# Altium schematic symbol library jlcpcb_2025_04_ferrites_extended_0603.schlib: 833 symbols (part 4 of 4) (continued)
## UPZ1608G600-1R2TF
designator FB?  Impedance @ Frequency: 60Ω@100MHz
Ferrite, 60Ω@100MHz, ±25%, 100mΩ, 1.2A, SMD 0603; Manufacturer: Sunlord; Manufacturer Part Number: UPZ1608G600-1R2TF; Package Size: 0603; JLCPCB Basic Part: No; JLCPCB Part Number: C305248; Supplier 1: LCSC; Category: Ferrite Beads; Supplier Part Number 1: C305248; Tolerance: ±25%; Rated Current: 1.2A; DC Resistance: 100mΩ; RoHS: Yes; ComponentLink1Description: Datasheet; ComponentLink1URL: https://wmsc.lcsc.com/wmsc/upload/file/pdf/v2/lcsc/2310301641_Sunlord-UPZ1608G600-1R2TF_C305248.pdf; ComponentLink2Description: JLCPCB Part URL; ComponentLink2URL: https://jlcpcb.com/partdetail/C305248; ComponentLink3Description: LCSC Part URL; ComponentLink3URL: https://lcsc.com/product-detail/Ferrite-Beads_Sunlord-Sunlord-UPZ1608G600-1R2TF_C305248.html
footprint FB-0603 (0603 (1608M) Ferrite)
pins: 1, 2

## UPZ1608U121-3R0TF
designator FB?  Impedance @ Frequency: 120Ω@100MHz
Ferrite, 120Ω@100MHz, ±25%, 3A, SMD 0603; Manufacturer: Sunlord; Manufacturer Part Number: UPZ1608U121-3R0TF; Package Size: 0603; JLCPCB Basic Part: No; JLCPCB Part Number: C370571; Supplier 1: LCSC; Category: Ferrite Beads; Supplier Part Number 1: C370571; Tolerance: ±25%; Rated Current: 3A; RoHS: Yes; ComponentLink1Description: Datasheet; ComponentLink1URL: https://wmsc.lcsc.com/wmsc/upload/file/pdf/v2/lcsc/2310301641_Sunlord-UPZ1608U121-3R0TF_C370571.pdf; ComponentLink2Description: JLCPCB Part URL; ComponentLink2URL: https://jlcpcb.com/partdetail/C370571; ComponentLink3Description: LCSC Part URL; ComponentLink3URL: https://lcsc.com/product-detail/Ferrite-Beads_Sunlord-Sunlord-UPZ1608U121-3R0TF_C370571.html
pins: 1, 2

## UPZ1608U220-6R0TF
designator FB?  Impedance @ Frequency: 22Ω@100MHz
Ferrite, 22Ω@100MHz, ±25%, 10mΩ, 6A, SMD 0603; Manufacturer: Sunlord; Manufacturer Part Number: UPZ1608U220-6R0TF; Package Size: 0603; JLCPCB Basic Part: No; JLCPCB Part Number: C98301; Supplier 1: LCSC; Category: Ferrite Beads; Supplier Part Number 1: C98301; Tolerance: ±25%; Rated Current: 6A; DC Resistance: 10mΩ; RoHS: Yes; ComponentLink1Description: Datasheet; ComponentLink1URL: https://wmsc.lcsc.com/wmsc/upload/file/pdf/v2/lcsc/2310301641_Sunlord-UPZ1608U220-6R0TF_C98301.pdf; ComponentLink2Description: JLCPCB Part URL; ComponentLink2URL: https://jlcpcb.com/partdetail/C98301; ComponentLink3Description: LCSC Part URL; ComponentLink3URL: https://lcsc.com/product-detail/Ferrite-Beads_Sunlord-Sunlord-UPZ1608U220-6R0TF_C98301.html
footprint FB-0603 (0603 (1608M) Ferrite)
pins: 1, 2

## UPZ1608U221-2R2TF
designator FB?  Impedance @ Frequency: 220Ω@100MHz
Ferrite, 220Ω@100MHz, ±25%, 50mΩ, 2.2A, SMD 0603; Manufacturer: Sunlord; Manufacturer Part Number: UPZ1608U221-2R2TF; Package Size: 0603; JLCPCB Basic Part: No; JLCPCB Part Number: C279745; Supplier 1: LCSC; Category: Ferrite Beads; Supplier Part Number 1: C279745; Tolerance: ±25%; Rated Current: 2.2A; DC Resistance: 50mΩ; RoHS: Yes; ComponentLink1Description: Datasheet; ComponentLink1URL: https://wmsc.lcsc.com/wmsc/upload/file/pdf/v2/lcsc/2310301641_Sunlord-UPZ1608U221-2R2TF_C279745.pdf; ComponentLink2Description: JLCPCB Part URL; ComponentLink2URL: https://jlcpcb.com/partdetail/C279745; ComponentLink3Description: LCSC Part URL; ComponentLink3URL: https://lcsc.com/product-detail/Ferrite-Beads_Sunlord-Sunlord-UPZ1608U221-2R2TF_C279745.html
footprint FB-0603 (0603 (1608M) Ferrite)
pins: 1, 2

## UPZ1608U280-6R0TF
designator FB?  Impedance @ Frequency: 28Ω@100MHz
Ferrite, 28Ω@100MHz, ±25%, 10mΩ, 6A, SMD 0603; Manufacturer: Sunlord; Manufacturer Part Number: UPZ1608U280-6R0TF; Package Size: 0603; JLCPCB Basic Part: No; JLCPCB Part Number: C98302; Supplier 1: LCSC; Category: Ferrite Beads; Supplier Part Number 1: C98302; Tolerance: ±25%; Rated Current: 6A; DC Resistance: 10mΩ; RoHS: Yes; ComponentLink1Description: Datasheet; ComponentLink1URL: https://wmsc.lcsc.com/wmsc/upload/file/pdf/v2/lcsc/2310301641_Sunlord-UPZ1608U280-6R0TF_C98302.pdf; ComponentLink2Description: JLCPCB Part URL; ComponentLink2URL: https://jlcpcb.com/partdetail/C98302; ComponentLink3Description: LCSC Part URL; ComponentLink3URL: https://lcsc.com/product-detail/Ferrite-Beads_Sunlord-Sunlord-UPZ1608U280-6R0TF_C98302.html
footprint FB-0603 (0603 (1608M) Ferrite)
pins: 1, 2

## UPZ1608U301-1R5TF
designator FB?  Impedance @ Frequency: 300Ω@100MHz
Ferrite, 300Ω@100MHz, ±25%, 1.5A, SMD 0603; Manufacturer: Sunlord; Manufacturer Part Number: UPZ1608U301-1R5TF; Package Size: 0603; JLCPCB Basic Part: No; JLCPCB Part Number: C370572; Supplier 1: LCSC; Category: Ferrite Beads; Supplier Part Number 1: C370572; Tolerance: ±25%; Rated Current: 1.5A; RoHS: Yes; ComponentLink1Description: Datasheet; ComponentLink1URL: https://wmsc.lcsc.com/wmsc/upload/file/pdf/v2/lcsc/2310301641_Sunlord-UPZ1608U301-1R5TF_C370572.pdf; ComponentLink2Description: JLCPCB Part URL; ComponentLink2URL: https://jlcpcb.com/partdetail/C370572; ComponentLink3Description: LCSC Part URL; ComponentLink3URL: https://lcsc.com/product-detail/Ferrite-Beads_Sunlord-Sunlord-UPZ1608U301-1R5TF_C370572.html
pins: 1, 2

## UPZ1608U331-1R5TF
designator FB?  Impedance @ Frequency: 330Ω@100MHz
Ferrite, 330Ω@100MHz, ±25%, 70mΩ, 1.5A, SMD 0603; Manufacturer: Sunlord; Manufacturer Part Number: UPZ1608U331-1R5TF; Package Size: 0603; JLCPCB Basic Part: No; JLCPCB Part Number: C96999; Supplier 1: LCSC; Category: Ferrite Beads; Supplier Part Number 1: C96999; Tolerance: ±25%; Rated Current: 1.5A; DC Resistance: 70mΩ; RoHS: Yes; ComponentLink1Description: Datasheet; ComponentLink1URL: https://wmsc.lcsc.com/wmsc/upload/file/pdf/v2/lcsc/2310301641_Sunlord-UPZ1608U331-1R5TF_C96999.pdf; ComponentLink2Description: JLCPCB Part URL; ComponentLink2URL: https://jlcpcb.com/partdetail/C96999; ComponentLink3Description: LCSC Part URL; ComponentLink3URL: https://lcsc.com/product-detail/Ferrite-Beads_Sunlord-Sunlord-UPZ1608U331-1R5TF_C96999.html
footprint FB-0603 (0603 (1608M) Ferrite)
pins: 1, 2

## UPZ1608U331-1R7TF
designator FB?  Impedance @ Frequency: 330Ω@100MHz
Ferrite, 330Ω@100MHz, ±25%, 1.7A, SMD 0603; Manufacturer: Sunlord; Manufacturer Part Number: UPZ1608U331-1R7TF; Package Size: 0603; JLCPCB Basic Part: No; JLCPCB Part Number: C370573; Supplier 1: LCSC; Category: Ferrite Beads; Supplier Part Number 1: C370573; Tolerance: ±25%; Rated Current: 1.7A; RoHS: Yes; ComponentLink1Description: Datasheet; ComponentLink1URL: https://wmsc.lcsc.com/wmsc/upload/file/pdf/v2/lcsc/2310301641_Sunlord-UPZ1608U331-1R7TF_C370573.pdf; ComponentLink2Description: JLCPCB Part URL; ComponentLink2URL: https://jlcpcb.com/partdetail/C370573; ComponentLink3Description: LCSC Part URL; ComponentLink3URL: https://lcsc.com/product-detail/Ferrite-Beads_Sunlord-Sunlord-UPZ1608U331-1R7TF_C370573.html
pins: 1, 2

## UPZ1608U471-1R5TF
designator FB?  Impedance @ Frequency: 470Ω@100MHz
Ferrite, 470Ω@100MHz, ±25%, 120mΩ, 1.5A, SMD 0603; Manufacturer: Sunlord; Manufacturer Part Number: UPZ1608U471-1R5TF; Package Size: 0603; JLCPCB Basic Part: No; JLCPCB Part Number: C74335; Supplier 1: LCSC; Category: Ferrite Beads; Supplier Part Number 1: C74335; Tolerance: ±25%; Rated Current: 1.5A; DC Resistance: 120mΩ; RoHS: Yes; ComponentLink1Description: Datasheet; ComponentLink1URL: https://wmsc.lcsc.com/wmsc/upload/file/pdf/v2/lcsc/2310301641_Sunlord-UPZ1608U471-1R5TF_C74335.pdf; ComponentLink2Description: JLCPCB Part URL; ComponentLink2URL: https://jlcpcb.com/partdetail/C74335; ComponentLink3Description: LCSC Part URL; ComponentLink3URL: https://lcsc.com/product-detail/Ferrite-Beads_Sunlord-Sunlord-UPZ1608U471-1R5TF_C74335.html
footprint FB-0603 (0603 (1608M) Ferrite)
pins: 1, 2

## UPZ1608U601-1R3TF
designator FB?  Impedance @ Frequency: 600Ω@100MHz
Ferrite, 600Ω@100MHz, ±25%, 150mΩ, 1.3A, SMD 0603; Manufacturer: Sunlord; Manufacturer Part Number: UPZ1608U601-1R3TF; Package Size: 0603; JLCPCB Basic Part: No; JLCPCB Part Number: C97000; Supplier 1: LCSC; Category: Ferrite Beads; Supplier Part Number 1: C97000; Tolerance: ±25%; Rated Current: 1.3A; DC Resistance: 150mΩ; RoHS: Yes; ComponentLink1Description: Datasheet; ComponentLink1URL: https://wmsc.lcsc.com/wmsc/upload/file/pdf/v2/lcsc/2310301642_Sunlord-UPZ1608U601-1R3TF_C97000.pdf; ComponentLink2Description: JLCPCB Part URL; ComponentLink2URL: https://jlcpcb.com/partdetail/C97000; ComponentLink3Description: LCSC Part URL; ComponentLink3URL: https://lcsc.com/product-detail/Ferrite-Beads_Sunlord-Sunlord-UPZ1608U601-1R3TF_C97000.html
footprint FB-0603 (0603 (1608M) Ferrite)
pins: 1, 2

## UPZ1608U700-4R0TF
designator FB?  Impedance @ Frequency: 70Ω@100MHz
Ferrite, 70Ω@100MHz, ±25%, 20mΩ, 4A, SMD 0603; Manufacturer: Sunlord; Manufacturer Part Number: UPZ1608U700-4R0TF; Package Size: 0603; JLCPCB Basic Part: No; JLCPCB Part Number: C361653; Supplier 1: LCSC; Category: Ferrite Beads; Supplier Part Number 1: C361653; Tolerance: ±25%; Rated Current: 4A; DC Resistance: 20mΩ; RoHS: Yes; ComponentLink1Description: Datasheet; ComponentLink1URL: https://wmsc.lcsc.com/wmsc/upload/file/pdf/v2/lcsc/2310301642_Sunlord-UPZ1608U700-4R0TF_C361653.pdf; ComponentLink2Description: JLCPCB Part URL; ComponentLink2URL: https://jlcpcb.com/partdetail/C361653; ComponentLink3Description: LCSC Part URL; ComponentLink3URL: https://lcsc.com/product-detail/Ferrite-Beads_Sunlord-Sunlord-UPZ1608U700-4R0TF_C361653.html
footprint FB-0603 (0603 (1608M) Ferrite)
pins: 1, 2

## UPZ1608W260-6R0TF
designator FB?  Impedance @ Frequency: 26Ω@100MHz
Ferrite, 26Ω@100MHz, ±25%, 7mΩ, 6A, SMD 0603; Manufacturer: Sunlord; Manufacturer Part Number: UPZ1608W260-6R0TF; Package Size: 0603; JLCPCB Basic Part: No; JLCPCB Part Number: C370575; Supplier 1: LCSC; Category: Ferrite Beads; Supplier Part Number 1: C370575; Tolerance: ±25%; Rated Current: 6A; DC Resistance: 7mΩ; RoHS: Yes; ComponentLink1Description: Datasheet; ComponentLink1URL: https://wmsc.lcsc.com/wmsc/upload/file/pdf/v2/lcsc/2310301642_Sunlord-UPZ1608W260-6R0TF_C370575.pdf; ComponentLink2Description: JLCPCB Part URL; ComponentLink2URL: https://jlcpcb.com/partdetail/C370575; ComponentLink3Description: LCSC Part URL; ComponentLink3URL: https://lcsc.com/product-detail/Ferrite-Beads_Sunlord-Sunlord-UPZ1608W260-6R0TF_C370575.html
footprint FB-0603 (0603 (1608M) Ferrite)
pins: 1, 2

## VPB160808T-471Y-N
designator FB?  Impedance @ Frequency: 470Ω@100MHz
Ferrite, 470Ω@100MHz, ±25%, 0.1Ω, 2000mA, SMD 0603; Manufacturer: Chilisin Elec; Manufacturer Part Number: VPB160808T-471Y-N; Package Size: 0603; JLCPCB Basic Part: No; JLCPCB Part Number: C365718; Supplier 1: LCSC; Category: Ferrite Beads; Supplier Part Number 1: C365718; Tolerance: ±25%; Rated Current: 2000mA; DC Resistance: 0.1Ω; RoHS: Yes; ComponentLink1Description: Datasheet; ComponentLink1URL: https://wmsc.lcsc.com/wmsc/upload/file/pdf/v2/lcsc/1912111437_Chilisin-Elec-VPB160808T-471Y-N_C365718.pdf; ComponentLink2Description: JLCPCB Part URL; ComponentLink2URL: https://jlcpcb.com/partdetail/C365718; ComponentLink3Description: LCSC Part URL; ComponentLink3URL: https://lcsc.com/product-detail/Ferrite-Beads_Chilisin-Elec-Chilisin-Elec-VPB160808T-471Y-N_C365718.html
footprint FB-0603 (0603 (1608M) Ferrite)
pins: 1, 2

## VPB160808T-600Y-N
designator FB?  Impedance @ Frequency: 60Ω@100MHz
Ferrite, 60Ω@100MHz, ±25%, 0.03Ω, 3000mA, SMD 0603; Manufacturer: Chilisin Elec; Manufacturer Part Number: VPB160808T-600Y-N; Package Size: 0603; JLCPCB Basic Part: No; JLCPCB Part Number: C285586; Supplier 1: LCSC; Category: Ferrite Beads; Supplier Part Number 1: C285586; Tolerance: ±25%; Rated Current: 3000mA; DC Resistance: 0.03Ω; RoHS: Yes; ComponentLink1Description: Datasheet; ComponentLink1URL: https://wmsc.lcsc.com/wmsc/upload/file/pdf/v2/lcsc/2304140030_Chilisin-Elec-VPB160808T-600Y-N_C285586.pdf; ComponentLink2Description: JLCPCB Part URL; ComponentLink2URL: https://jlcpcb.com/partdetail/C285586; ComponentLink3Description: LCSC Part URL; ComponentLink3URL: https://lcsc.com/product-detail/Ferrite-Beads_Chilisin-Elec-Chilisin-Elec-VPB160808T-600Y-N_C285586.html
footprint FB-0603 (0603 (1608M) Ferrite)
pins: 1, 2

## VPB160808T-601Y-N
designator FB?  Impedance @ Frequency: 600Ω@100MHz
Ferrite, 600Ω@100MHz, ±25%, 0.1Ω, 2000mA, SMD 0603; Manufacturer: Chilisin Elec; Manufacturer Part Number: VPB160808T-601Y-N; Package Size: 0603; JLCPCB Basic Part: No; JLCPCB Part Number: C142024; Supplier 1: LCSC; Category: Ferrite Beads; Supplier Part Number 1: C142024; Tolerance: ±25%; Rated Current: 2000mA; DC Resistance: 0.1Ω; RoHS: Yes; ComponentLink1Description: Datasheet; ComponentLink1URL: https://wmsc.lcsc.com/wmsc/upload/file/pdf/v2/lcsc/2304140030_Chilisin-Elec-VPB160808T-601Y-N_C142024.pdf; ComponentLink2Description: JLCPCB Part URL; ComponentLink2URL: https://jlcpcb.com/partdetail/C142024; ComponentLink3Description: LCSC Part URL; ComponentLink3URL: https://lcsc.com/product-detail/Ferrite-Beads_Chilisin-Elec-Chilisin-Elec-VPB160808T-601Y-N_C142024.html
footprint FB-0603 (0603 (1608M) Ferrite)
pins: 1, 2

## YB160808U102-0R5T
designator FB?  Impedance @ Frequency: 1kΩ@100MHz
Ferrite, 1kΩ@100MHz, ±25%, 550mΩ, 500mA, SMD 0603; Manufacturer: YJYCOIN; Manufacturer Part Number: YB160808U102-0R5T; Package Size: 0603; JLCPCB Basic Part: No; JLCPCB Part Number: C3011207; Supplier 1: LCSC; Category: Ferrite Beads; Supplier Part Number 1: C3011207; Tolerance: ±25%; Rated Current: 500mA; DC Resistance: 550mΩ; RoHS: Yes; ComponentLink1Description: Datasheet; ComponentLink1URL: https://wmsc.lcsc.com/wmsc/upload/file/pdf/v2/lcsc/2205091530_YJYCOIN-YB160808U102-0R5T_C3011207.pdf; ComponentLink2Description: JLCPCB Part URL; ComponentLink2URL: https://jlcpcb.com/partdetail/C3011207; ComponentLink3Description: LCSC Part URL; ComponentLink3URL: https://lcsc.com/product-detail/Ferrite-Beads_YJYCOIN-YJYCOIN-YB160808U102-0R5T_C3011207.html
footprint FB-0603 (0603 (1608M) Ferrite)
pins: 1, 2

## YI160808U100-3R0T
designator FB?  Impedance @ Frequency: 10Ω@100MHz
Ferrite, 10Ω@100MHz, ±25%, 30mΩ, 3A, SMD 0603; Manufacturer: YJYCOIN; Manufacturer Part Number: YI160808U100-3R0T; Package Size: 0603; JLCPCB Basic Part: No; JLCPCB Part Number: C3011209; Supplier 1: LCSC; Category: Ferrite Beads; Supplier Part Number 1: C3011209; Tolerance: ±25%; Rated Current: 3A; DC Resistance: 30mΩ; RoHS: Yes; ComponentLink1Description: Datasheet; ComponentLink1URL: https://wmsc.lcsc.com/wmsc/upload/file/pdf/v2/lcsc/2205091530_YJYCOIN-YI160808U100-3R0T_C3011209.pdf; ComponentLink2Description: JLCPCB Part URL; ComponentLink2URL: https://jlcpcb.com/partdetail/C3011209; ComponentLink3Description: LCSC Part URL; ComponentLink3URL: https://lcsc.com/product-detail/Ferrite-Beads_YJYCOIN-YJYCOIN-YI160808U100-3R0T_C3011209.html
footprint FB-0603 (0603 (1608M) Ferrite)
pins: 1, 2

## YI160808U100-5R0T
designator FB?  Impedance @ Frequency: 10Ω@100MHz
Ferrite, 10Ω@100MHz, ±25%, 10mΩ, 5A, SMD 0603; Manufacturer: YJYCOIN; Manufacturer Part Number: YI160808U100-5R0T; Package Size: 0603; JLCPCB Basic Part: No; JLCPCB Part Number: C2971881; Supplier 1: LCSC; Category: Ferrite Beads; Supplier Part Number 1: C2971881; Tolerance: ±25%; Rated Current: 5A; DC Resistance: 10mΩ; RoHS: Yes; ComponentLink1Description: Datasheet; ComponentLink1URL: https://wmsc.lcsc.com/wmsc/upload/file/pdf/v2/lcsc/2201241630_YJYCOIN-YI160808U100-5R0T_C2971881.pdf; ComponentLink2Description: JLCPCB Part URL; ComponentLink2URL: https://jlcpcb.com/partdetail/C2971881; ComponentLink3Description: LCSC Part URL; ComponentLink3URL: https://lcsc.com/product-detail/Ferrite-Beads_YJYCOIN-YJYCOIN-YI160808U100-5R0T_C2971881.html
footprint FB-0603 (0603 (1608M) Ferrite)
pins: 1, 2

## YI160808U102-0R8T
designator FB?  Impedance @ Frequency: 1kΩ@100MHz
Ferrite, 1kΩ@100MHz, ±25%, 450mΩ, 800mA, SMD 0603; Manufacturer: YJYCOIN; Manufacturer Part Number: YI160808U102-0R8T; Package Size: 0603; JLCPCB Basic Part: No; JLCPCB Part Number: C2971885; Supplier 1: LCSC; Category: Ferrite Beads; Supplier Part Number 1: C2971885; Tolerance: ±25%; Rated Current: 800mA; DC Resistance: 450mΩ; RoHS: Yes; ComponentLink1Description: Datasheet; ComponentLink1URL: https://wmsc.lcsc.com/wmsc/upload/file/pdf/v2/lcsc/2201241630_YJYCOIN-YI160808U102-0R8T_C2971885.pdf; ComponentLink2Description: JLCPCB Part URL; ComponentLink2URL: https://jlcpcb.com/partdetail/C2971885; ComponentLink3Description: LCSC Part URL; ComponentLink3URL: https://lcsc.com/product-detail/Ferrite-Beads_YJYCOIN-YJYCOIN-YI160808U102-0R8T_C2971885.html
footprint FB-0603 (0603 (1608M) Ferrite)
pins: 1, 2

## YI160808U121-2R5T
designator FB?  Impedance @ Frequency: 120Ω@100MHz
Ferrite, 120Ω@100MHz, ±25%, 100mΩ, 2.5A, SMD 0603; Manufacturer: YJYCOIN; Manufacturer Part Number: YI160808U121-2R5T; Package Size: 0603; JLCPCB Basic Part: No; JLCPCB Part Number: C2858465; Supplier 1: LCSC; Category: Ferrite Beads; Supplier Part Number 1: C2858465; Tolerance: ±25%; Rated Current: 2.5A; DC Resistance: 100mΩ; RoHS: Yes; ComponentLink1Description: Datasheet; ComponentLink2Description: JLCPCB Part URL; ComponentLink2URL: https://jlcpcb.com/partdetail/C2858465; ComponentLink3Description: LCSC Part URL; ComponentLink3URL: https://lcsc.com/product-detail/Ferrite-Beads_YJYCOIN-YJYCOIN-YI160808U121-2R5T_C2858465.html
footprint FB-0603 (0603 (1608M) Ferrite)
pins: 1, 2

## YI160808U121-3R0T
designator FB?  Impedance @ Frequency: 120Ω@100MHz
Ferrite, 120Ω@100MHz, ±25%, 50mΩ, 3A, SMD 0603; Manufacturer: YJYCOIN; Manufacturer Part Number: YI160808U121-3R0T; Package Size: 0603; JLCPCB Basic Part: No; JLCPCB Part Number: C2971883; Supplier 1: LCSC; Category: Ferrite Beads; Supplier Part Number 1: C2971883; Tolerance: ±25%; Rated Current: 3A; DC Resistance: 50mΩ; RoHS: Yes; ComponentLink1Description: Datasheet; ComponentLink1URL: https://wmsc.lcsc.com/wmsc/upload/file/pdf/v2/lcsc/2201241630_YJYCOIN-YI160808U121-3R0T_C2971883.pdf; ComponentLink2Description: JLCPCB Part URL; ComponentLink2URL: https://jlcpcb.com/partdetail/C2971883; ComponentLink3Description: LCSC Part URL; ComponentLink3URL: https://lcsc.com/product-detail/Ferrite-Beads_YJYCOIN-YJYCOIN-YI160808U121-3R0T_C2971883.html
footprint FB-0603 (0603 (1608M) Ferrite)
pins: 1, 2

## YI160808U181-2R0T
designator FB?  Impedance @ Frequency: 180Ω@100MHz
Ferrite, 180Ω@100MHz, ±25%, 150mΩ, 2A, SMD 0603; Manufacturer: YJYCOIN; Manufacturer Part Number: YI160808U181-2R0T; Package Size: 0603; JLCPCB Basic Part: No; JLCPCB Part Number: C3011211; Supplier 1: LCSC; Category: Ferrite Beads; Supplier Part Number 1: C3011211; Tolerance: ±25%; Rated Current: 2A; DC Resistance: 150mΩ; RoHS: Yes; ComponentLink1Description: Datasheet; ComponentLink1URL: https://wmsc.lcsc.com/wmsc/upload/file/pdf/v2/lcsc/2205091530_YJYCOIN-YI160808U181-2R0T_C3011211.pdf; ComponentLink2Description: JLCPCB Part URL; ComponentLink2URL: https://jlcpcb.com/partdetail/C3011211; ComponentLink3Description: LCSC Part URL; ComponentLink3URL: https://lcsc.com/product-detail/Ferrite-Beads_YJYCOIN-YJYCOIN-YI160808U181-2R0T_C3011211.html
footprint FB-0603 (0603 (1608M) Ferrite)
pins: 1, 2

## YI160808U221-2R0T
designator FB?  Impedance @ Frequency: 220Ω@100MHz
Ferrite, 220Ω@100MHz, ±25%, 0.15Ω, 2A, SMD 0603; Manufacturer: YJYCOIN; Manufacturer Part Number: YI160808U221-2R0T; Package Size: 0603; JLCPCB Basic Part: No; JLCPCB Part Number: C3011212; Supplier 1: LCSC; Category: Ferrite Beads; Supplier Part Number 1: C3011212; Tolerance: ±25%; Rated Current: 2A; DC Resistance: 0.15Ω; RoHS: Yes; ComponentLink1Description: Datasheet; ComponentLink1URL: https://wmsc.lcsc.com/wmsc/upload/file/pdf/v2/lcsc/2205091530_YJYCOIN-YI160808U221-2R0T_C3011212.pdf; ComponentLink2Description: JLCPCB Part URL; ComponentLink2URL: https://jlcpcb.com/partdetail/C3011212; ComponentLink3Description: LCSC Part URL; ComponentLink3URL: https://lcsc.com/product-detail/Ferrite-Beads_YJYCOIN-YJYCOIN-YI160808U221-2R0T_C3011212.html
footprint FB-0603 (0603 (1608M) Ferrite)
pins: 1, 2

## YI160808U300-3R0T
designator FB?  Impedance @ Frequency: 30Ω@100MHz
Ferrite, 30Ω@100MHz, ±25%, 0.03Ω, 3A, SMD 0603; Manufacturer: YJYCOIN; Manufacturer Part Number: YI160808U300-3R0T; Package Size: 0603; JLCPCB Basic Part: No; JLCPCB Part Number: C3011213; Supplier 1: LCSC; Category: Ferrite Beads; Supplier Part Number 1: C3011213; Tolerance: ±25%; Rated Current: 3A; DC Resistance: 0.03Ω; RoHS: Yes; ComponentLink1Description: Datasheet; ComponentLink1URL: https://wmsc.lcsc.com/wmsc/upload/file/pdf/v2/lcsc/2205091530_YJYCOIN-YI160808U300-3R0T_C3011213.pdf; ComponentLink2Description: JLCPCB Part URL; ComponentLink2URL: https://jlcpcb.com/partdetail/C3011213; ComponentLink3Description: LCSC Part URL; ComponentLink3URL: https://lcsc.com/product-detail/Ferrite-Beads_YJYCOIN-YJYCOIN-YI160808U300-3R0T_C3011213.html
footprint FB-0603 (0603 (1608M) Ferrite)
pins: 1, 2

## YI160808U300-5R0T
designator FB?  Impedance @ Frequency: 10Ω@100MHz
Ferrite, 10Ω@100MHz, ±25%, 20mΩ, 5A, SMD 0603; Manufacturer: YJYCOIN; Manufacturer Part Number: YI160808U300-5R0T; Package Size: 0603; JLCPCB Basic Part: No; JLCPCB Part Number: C2971882; Supplier 1: LCSC; Category: Ferrite Beads; Supplier Part Number 1: C2971882; Tolerance: ±25%; Rated Current: 5A; DC Resistance: 20mΩ; RoHS: Yes; ComponentLink1Description: Datasheet; ComponentLink1URL: https://wmsc.lcsc.com/wmsc/upload/file/pdf/v2/lcsc/2201241630_YJYCOIN-YI160808U300-5R0T_C2971882.pdf; ComponentLink2Description: JLCPCB Part URL; ComponentLink2URL: https://jlcpcb.com/partdetail/C2971882; ComponentLink3Description: LCSC Part URL; ComponentLink3URL: https://lcsc.com/product-detail/Ferrite-Beads_YJYCOIN-YJYCOIN-YI160808U300-5R0T_C2971882.html
footprint FB-0603 (0603 (1608M) Ferrite)
pins: 1, 2

## YI160808U600-3R0T
designator FB?  Impedance @ Frequency: 60Ω@100MHz
Ferrite, 60Ω@100MHz, ±25%, 40mΩ, 3A, SMD 0603; Manufacturer: YJYCOIN; Manufacturer Part Number: YI160808U600-3R0T; Package Size: 0603; JLCPCB Basic Part: No; JLCPCB Part Number: C2858464; Supplier 1: LCSC; Category: Ferrite Beads; Supplier Part Number 1: C2858464; Tolerance: ±25%; Rated Current: 3A; DC Resistance: 40mΩ; RoHS: Yes; ComponentLink1Description: Datasheet; ComponentLink2Description: JLCPCB Part URL; ComponentLink2URL: https://jlcpcb.com/partdetail/C2858464; ComponentLink3Description: LCSC Part URL; ComponentLink3URL: https://lcsc.com/product-detail/Ferrite-Beads_YJYCOIN-YJYCOIN-YI160808U600-3R0T_C2858464.html
footprint FB-0603 (0603 (1608M) Ferrite)
pins: 1, 2

## YI160808U601-1R0T
designator FB?  Impedance @ Frequency: 600Ω@100MHz
Ferrite, 600Ω@100MHz, ±25%, 200mΩ, 1A, SMD 0603; Manufacturer: YJYCOIN; Manufacturer Part Number: YI160808U601-1R0T; Package Size: 0603; JLCPCB Basic Part: No; JLCPCB Part Number: C3011214; Supplier 1: LCSC; Category: Ferrite Beads; Supplier Part Number 1: C3011214; Tolerance: ±25%; Rated Current: 1A; DC Resistance: 200mΩ; RoHS: Yes; ComponentLink1Description: Datasheet; ComponentLink1URL: https://wmsc.lcsc.com/wmsc/upload/file/pdf/v2/lcsc/2205091530_YJYCOIN-YI160808U601-1R0T_C3011214.pdf; ComponentLink2Description: JLCPCB Part URL; ComponentLink2URL: https://jlcpcb.com/partdetail/C3011214; ComponentLink3Description: LCSC Part URL; ComponentLink3URL: https://lcsc.com/product-detail/Ferrite-Beads_YJYCOIN-YJYCOIN-YI160808U601-1R0T_C3011214.html
footprint FB-0603 (0603 (1608M) Ferrite)
pins: 1, 2

## YI160808U601-2R0T
designator FB?  Impedance @ Frequency: 600Ω@100MHz
Ferrite, 600Ω@100MHz, ±25%, 10mΩ, 2A, SMD 0603; Manufacturer: YJYCOIN; Manufacturer Part Number: YI160808U601-2R0T; Package Size: 0603; JLCPCB Basic Part: No; JLCPCB Part Number: C2971884; Supplier 1: LCSC; Category: Ferrite Beads; Supplier Part Number 1: C2971884; Tolerance: ±25%; Rated Current: 2A; DC Resistance: 10mΩ; RoHS: Yes; ComponentLink1Description: Datasheet; ComponentLink1URL: https://wmsc.lcsc.com/wmsc/upload/file/pdf/v2/lcsc/2201241630_YJYCOIN-YI160808U601-2R0T_C2971884.pdf; ComponentLink2Description: JLCPCB Part URL; ComponentLink2URL: https://jlcpcb.com/partdetail/C2971884; ComponentLink3Description: LCSC Part URL; ComponentLink3URL: https://lcsc.com/product-detail/Ferrite-Beads_YJYCOIN-YJYCOIN-YI160808U601-2R0T_C2971884.html
footprint FB-0603 (0603 (1608M) Ferrite)
pins: 1, 2

## YI160808Z101-3R0T
designator FB?  Impedance @ Frequency: 100Ω@100MHz
Ferrite, 100Ω@100MHz, ±25%, 30mΩ, 3A, SMD 0603; Manufacturer: YJYCOIN; Manufacturer Part Number: YI160808Z101-3R0T; Package Size: 0603; JLCPCB Basic Part: No; JLCPCB Part Number: C3011210; Supplier 1: LCSC; Category: Ferrite Beads; Supplier Part Number 1: C3011210; Tolerance: ±25%; Rated Current: 3A; DC Resistance: 30mΩ; RoHS: Yes; ComponentLink1Description: Datasheet; ComponentLink1URL: https://wmsc.lcsc.com/wmsc/upload/file/pdf/v2/lcsc/2205091530_YJYCOIN-YI160808Z101-3R0T_C3011210.pdf; ComponentLink2Description: JLCPCB Part URL; ComponentLink2URL: https://jlcpcb.com/partdetail/C3011210; ComponentLink3Description: LCSC Part URL; ComponentLink3URL: https://lcsc.com/product-detail/Ferrite-Beads_YJYCOIN-YJYCOIN-YI160808Z101-3R0T_C3011210.html
footprint FB-0603 (0603 (1608M) Ferrite)
pins: 1, 2